# Altium footprint library Domino 3Pin.PcbLib: 350 footprints (part 16 of 22)
Each footprint in its own frame and in the unit in brackets; x right, y up, seen from the top. Pads: shape width x height; smd on the part's side, far side on the other; paste and mask are expansions set on the pad; w line width, h text height; cw(c..) or ccw(c..) is an arc to the next point about the centre after c.
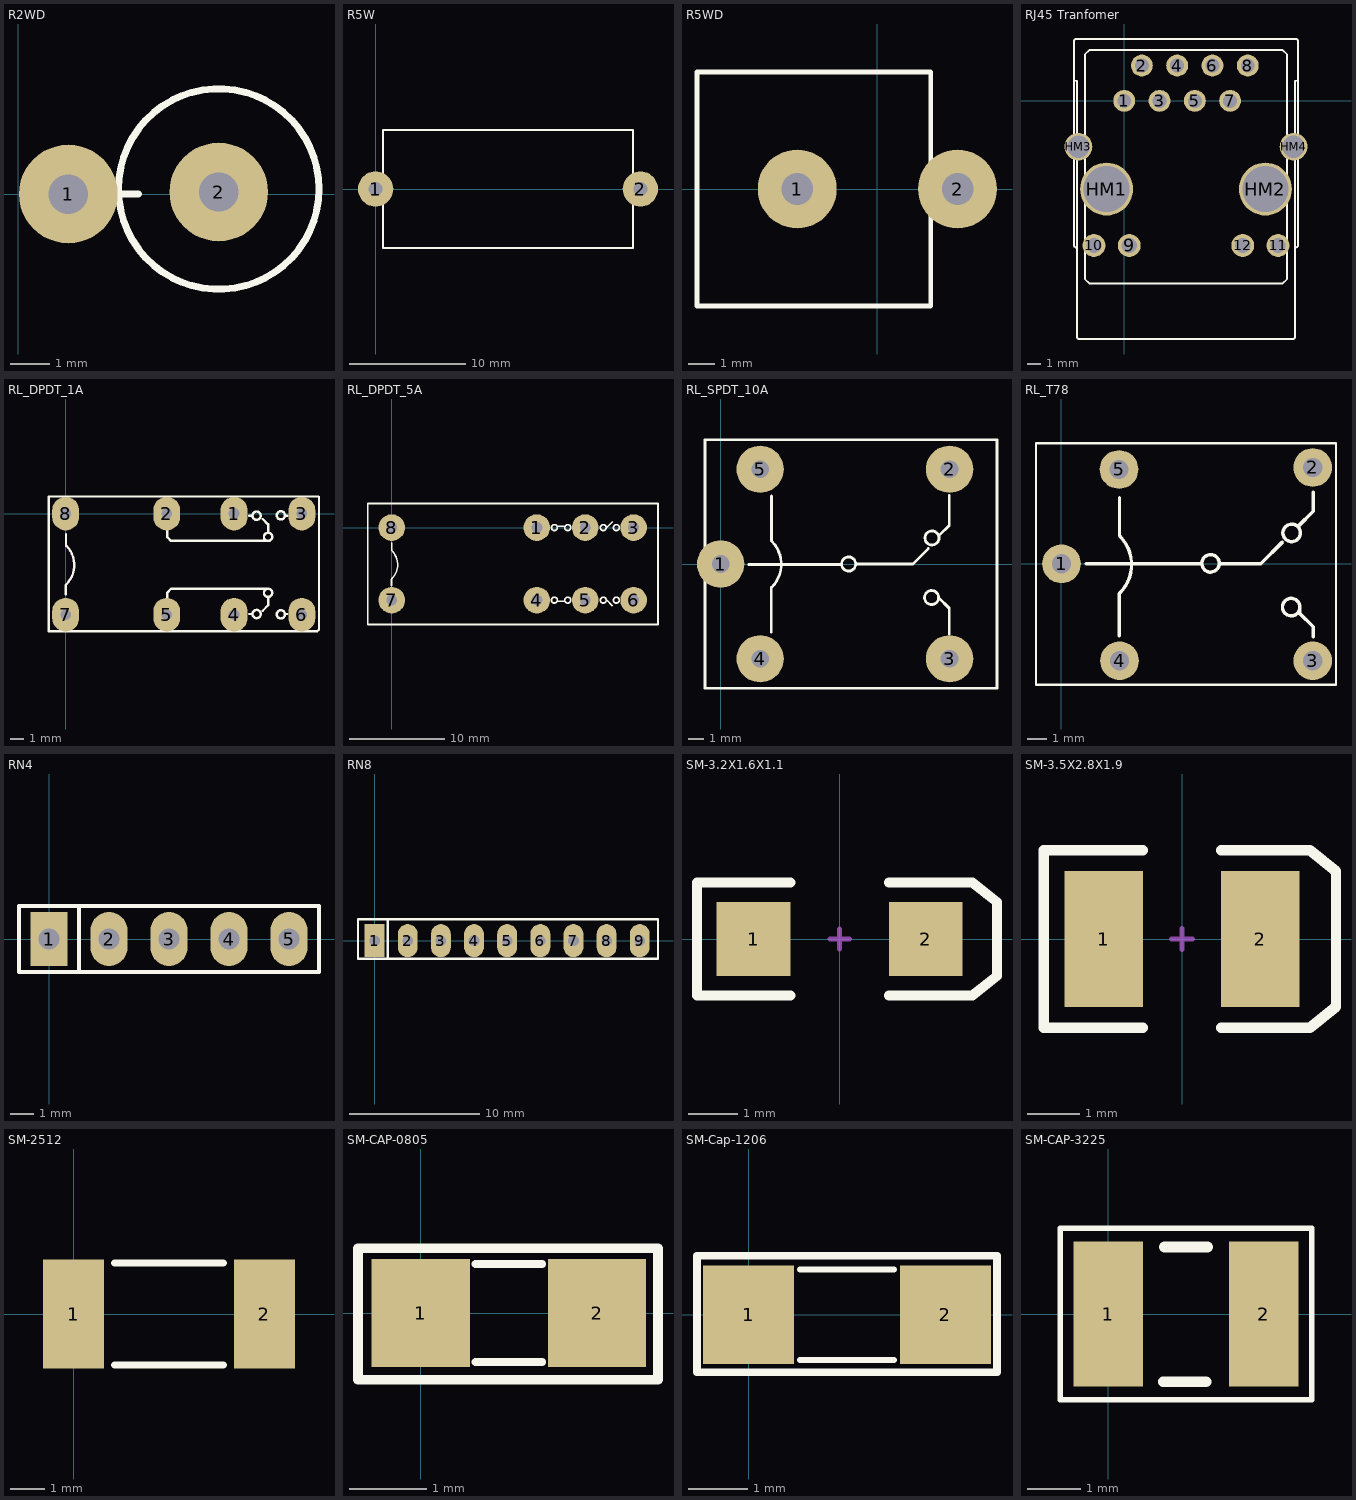
[diagram p15: the footprints below, top view; thin cyan lines are the x and y axes]

## R2WD [mm] "R2W, 2 pin, 700mil"
height 5.08
pads (2):
  round 2.5 hole 1: 1(1.27,0) 2(5.08,0.051)
Top Overlay:
  circle w0.178: c5.08,0.127 r2.54
  lines w0.178: 2.159,0 3.048,0

## R5W [mil] "R5W , 2 pin, 400 x 950mil"
height 400
pads (2):
  round 120 hole 47.24: 1(0,0) 2(900,0)
Top Overlay:
  lines w7: 25,-200 25,200 875,200 875,-200 25,-200
3D body "User Library-5W Resistor.STEP": height 362.6, standoff -98.43, extent -84.69,-190 954.68,191.89

## R5WD [mm] "R5W , 2 pin, 300 x 600 mil"
height 10.16
pads (2):
  round 3 hole 1.2: 1(-3.048,0) 2(3.048,0)
Top Overlay:
  lines w0.178: -6.858,-4.445 -6.858,4.445 2.032,4.445 2.032,-4.445 -6.858,-4.445
3D body "SW3dPS-5W Res.STEP": height 23.05, standoff -2.4, extent -8.648,-5.08 4.432,4.92

## RJ45 Tranfomer [mm]
pads (16):
  round 1.575 hole 1: 1(0,0) 2(1.27,2.54) 3(2.54,0) 4(3.81,2.54) 5(5.08,0) 6(6.35,2.54) 7(7.62,0) 8(8.89,2.54)
  round 1.65 hole 1.1: 9(0.36,-10.41) 10(-2.18,-10.41) 11(11.07,-10.41) 12(8.53,-10.41)
  round 3.81 hole 3.3: HM1(-1.27,-6.35) HM2(10.16,-6.35)
  round 2 hole 1.6: HM3(-3.3,-3.3) HM4(12.19,-3.3)
Top Overlay:
  lines w0.127: -3.62,1.45 -3.405,1.45 -3.405,-16.99 ccw(c-3.255,-16.99) -3.255,-17.14 12.145,-17.14 ccw(c12.145,-16.99) 12.295,-16.99 12.295,1.45 12.51,1.45 ; -3.405,-10.55 -3.47,-10.55 cw(c-3.47,-10.4) -3.62,-10.4 -3.62,4.3 cw(c-3.47,4.3) -3.47,4.45 12.36,4.45 cw(c12.36,4.3) 12.51,4.3 12.51,-10.4 cw(c12.36,-10.4) 12.36,-10.55 12.295,-10.55 ; -3.405,-3.81 -3.195,-3.81 -3.195,-2.79 -3.405,-2.79 ; -3.405,-3.61 -3.195,-3.61 ; -3.405,-2.99 -3.195,-2.99 ; -1.77,-7.764 cw(c-1.27,-6.35) -1.517,-7.829 ; -0.77,-7.764 ccw(c-1.27,-6.35) -0.77,-4.936 ; -0.132,-0.1 -0.132,0.1 ; 0.132,-0.1 0.132,0.1 ; 1.138,2.44 1.138,2.64 ; 1.402,2.44 1.402,2.64 ; 2.408,-0.1 2.408,0.1 ; 2.672,-0.1 2.672,0.1 ; 3.678,2.44 3.678,2.64 ; 3.942,2.44 3.942,2.64 ; 4.948,-0.1 4.948,0.1 ; 5.212,-0.1 5.212,0.1 ; 6.218,2.44 6.218,2.64 ; 6.482,2.44 6.482,2.64 ; 7.488,-0.1 7.488,0.1 ; 7.752,-0.1 7.752,0.1 ; 8.758,2.44 8.758,2.64 ; 9.022,2.44 9.022,2.64 ; 9.66,-7.764 cw(c10.16,-6.35) 9.66,-4.936 ; 10.16,-7.85 cw(c10.16,-6.35) 10.66,-7.764 ; 12.085,-3.61 12.295,-3.61 ; 12.085,-2.99 12.295,-2.99 ; 12.295,-3.81 12.085,-3.81 12.085,-2.79 12.295,-2.79 ; -2.82,-12.84 -2.52,-13.14 11.41,-13.14 11.71,-12.84 11.71,3.35 11.41,3.65 -2.52,3.65 -2.82,3.35 -2.82,-12.84 ; -2.43,-10.61 -1.93,-10.61 -1.93,-10.21 -2.43,-10.21 -2.43,-10.61 ; -1.77,-7.386 cw(c-1.27,-6.35) -1.77,-5.314 -1.77,-7.386 ; -0.77,-7.386 ccw(c-1.27,-6.35) -0.77,-5.314 -0.77,-7.386 ; -0.175,-0.1 0.175,-0.1 0.175,0.1 -0.175,0.1 -0.175,-0.1 ; 0.11,-10.61 0.61,-10.61 0.61,-10.21 0.11,-10.21 0.11,-10.61 ; 1.095,2.44 1.445,2.44 1.445,2.64 1.095,2.64 1.095,2.44 ; 2.365,-0.1 2.715,-0.1 2.715,0.1 2.365,0.1 2.365,-0.1 ; 3.635,2.44 3.985,2.44 3.985,2.64 3.635,2.64 3.635,2.44 ; 4.905,-0.1 4.905,0.1 5.255,0.1 5.255,-0.1 4.905,-0.1 ; 6.175,2.44 6.175,2.64 6.525,2.64 6.525,2.44 6.175,2.44 ; 7.445,-0.1 7.795,-0.1 7.795,0.1 7.445,0.1 7.445,-0.1 ; 8.28,-10.61 8.78,-10.61 8.78,-10.21 8.28,-10.21 8.28,-10.61 ; 8.715,2.44 9.065,2.44 9.065,2.64 8.715,2.64 8.715,2.44 ; 9.66,-7.386 cw(c10.16,-6.35) 9.66,-5.314 9.66,-7.386 ; 10.66,-7.386 ccw(c10.16,-6.35) 10.66,-5.314 10.66,-7.386 ; 10.82,-10.61 11.32,-10.61 11.32,-10.21 10.82,-10.21 10.82,-10.61
3D body "RJ45-SI-60062-F.STEP": height 13.84, standoff -3.35, extent -3.62,-17.143 12.51,4.447

## RL_DPDT_1A [mil] "Reley DPDT, 8 pin, 1A, W400mil, L800mil,H 300mil"
height 300
pads (8):
  oval 80x100 hole 32: 1(500,0) 2(300,0) 3(701,0) 4(500,-300) 5(300,-300) 6(701,-300) 7(0,-300) 8(0,0)
Top Overlay:
  circle w7: c638.76,-299 r12.24
  circle w7: c566.76,-298 r12.24
  circle w7: c600.76,-235 r12.24
  circle w7: c600.76,-69 r12.24
  circle w7: c566.76,-6 r12.24
  circle w7: c638.76,-5 r12.24
  lines w7: 0,-239 0,-212 ; 1,-211 ccw(c-56.5,-152.5) 2,-95 ; 1,-94 1,-61 ; 302,-255 302,-234 313,-223 599,-223 ; 302,-42 302,-70 313,-81 599,-81 ; 544,-298 552,-298 ; 544,-6 552,-6 ; 585,-288 601,-272 601,-249 ; 585,-16 601,-32 601,-55 ; 653,-298 658,-298 ; 653,-6 658,-6 ; -50,-349 -50,51 750,51 752,49 752,-344 747,-349 -50,-349
3D body "SW3dPS-DSY2Y.STEP": height 484.25, standoff -118.11, extent -59.45,-340 759.45,45.83

## RL_DPDT_5A [mil] "Reley DPDT, 8 pin, 5A, W500mil, L1100mil,H 950mil"
height 300
pads (8):
  round 110 hole 45: 1(600,0) 2(800,0) 3(1000,0) 4(600,-300) 5(800,-300) 6(1000,-300) 7(0,-300) 8(0,0)
Top Overlay:
  circle w7: c928.76,-300 r12.24
  circle w7: c874.76,-300 r12.24
  circle w7: c727.76,-300 r12.24
  circle w7: c672.76,-300 r12.24
  circle w7: c672.76,0 r12.24
  circle w7: c727.76,0 r12.24
  circle w7: c874.76,0 r12.24
  circle w7: c928.76,0 r12.24
  lines w7: -1,-240 -1,-213 ; 0,-212 ccw(c-57.5,-153.5) 1,-96 ; 0,-95 0,-62 ; 687,-305 716,-305 ; 687,5 716,5 ; 888,-299 912,-323 ; 888,-1 912,23 ; -99,-401 1101,-401 1101,100 -99,100 -99,-401

## RL_SPDT_10A [mil] "Relay SPDT, 5 pin, 10A,W 650mil, L 800mil, H 800mil"
height 800
pads (5):
  round 120 hole 45: 1(0,0) 2(580,240) 3(580,-240) 4(100,-240) 5(100,240)
Top Overlay:
  circle w7: c324.2,0 r17.8
  circle w7: c535.2,66 r17.8
  circle w7: c534.2,-85 r17.8
  lines w7: 71,-1 304,-1 ; 128,-173 128,-60 ; 129,-59 ccw(c71.5,-0.5) 130,57 ; 129,58 129,172 ; 344,0 487,0 526,39 ; 552,-85 579,-112 579,-178 ; 553,72 579,98 579,174 ; -40,-315 700,-315 700,315 -40,315 -40,-315
3D body "User Library-SONGLE Relay SRU-12VDC-SL-C.step": height 602.36, standoff -196.85, extent -45.98,-304.24 705.98,306

## RL_T78 [mm]
pads (5):
  round 2 hole 1: 1(0.025,0) 2(13.005,4.978) 3(13.005,-5.004) 4(3.023,-5.004) 5(2.997,4.877)
Top Overlay:
  circle w0.178: c11.892,-2.235 r0.452
  circle w0.178: c11.918,1.6 r0.452
  circle w0.178: c7.727,0.025 r0.452
  lines w0.127: -1.293,-6.258 -1.293,6.242 14.207,6.242 14.207,-6.258 -1.293,-6.258
  lines w0.178: 1.295,0 7.214,0 ; 2.997,-3.708 2.997,-1.549 ; 3.023,-1.524 ccw(c1.562,-0.038) 3.048,1.422 ; 3.023,1.448 3.023,3.429 ; 8.23,0 10.16,0 10.312,0 11.443,1.13 ; 12.243,1.93 13.03,2.718 13.03,3.708 ; 12.344,-2.235 12.344,-2.565 13.03,-3.251 13.03,-3.759
3D body: height 13.5, standoff 0, extent -1.295,-6.248 14.199,6.223

## RN4 [mil] "R SIP4, 5 Pin"
height 200
pads (5):
  rect 62x90 hole 35: 1(0,0)
  oval 62x90 hole 35: 2(100,0) 3(200,0) 4(300,0) 5(400,0)
Top Overlay:
  lines w7: 50,-55 50,55 ; -50,-55 -50,55 450,55 450,-55 -50,-55

## RN8 [mil] "R SIP8, 9 Pin"
height 200
pads (9):
  rect 60x100 hole 32: 1(0,0)
  oval 60x100 hole 32: 2(100,0) 3(200,0) 4(300,0) 5(400,0) 6(500,0) 7(600,0) 8(700,0) 9(800,0)
Top Overlay:
  lines w7: 40,-55 40,65 ; -50,-55 -50,65 855,65 855,-55 -50,-55
3D body "SW3dPS-Resistor Networks-1.STEP": height 219.29, standoff -115.35, extent -42.91,-20 842.92,29.21

## SM-3.2X1.6X1.1 [mm] "SMT LED; 2 Flat Leads"
height 1.2
pads (2):
  rect 1.5x1.5 smd: 1(-1.75,0) 2(1.75,0)
Top Overlay:
  lines w0.2: -1,-1.15 -2.9,-1.15 -2.9,1.15 -1,1.15 ; 1,-1.15 2.7,-1.15 3.2,-0.75 3.2,0.75 2.7,1.15 1,1.15
Mechanical 1:
  lines w0.1: -0.2,0 0.2,0 ; 0,-0.2 0,0.2
3D body "SW3DPS-RESISTOR 1206-DEFAULT.STEP": height 0.53, standoff -0.03, extent -1.473,-0.889 1.727,0.771

## SM-3.5X2.8X1.9 [mm] "SM LED; 2 C-Bend Leads; Body 3.5 x 2.8 x 1.9 mm, inc leads (LxWxH typ)"
height 1.9
pads (2):
  rect 1.5x2.6 smd: 1(-1.5,0) 2(1.5,0)
Top Overlay:
  lines w0.2: -0.75,-1.7 -2.65,-1.7 -2.65,1.7 -0.75,1.7 ; 0.75,-1.7 2.45,-1.7 2.95,-1.3 2.95,1.3 2.45,1.7 0.75,1.7
Mechanical 1:
  lines w0.1: -0.2,0 0.2,0 ; 0,-0.2 0,0.2

## SM-2512 [mm] "Chip Resistor; Body 6.3 x 3.2 mm (LxW typ) - C"
height 0.6
pads (2):
  rect 1.8x3.2 smd: 1(0,0) 2(5.6,0)
Top Overlay:
  lines w0.2: 1.2,-1.5 4.4,-1.5 ; 1.2,1.5 4.4,1.5
3D body "Resistor SMD 2512.step": height 0.62, standoff 0, extent -0.492,-1.575 5.827,1.626

## SM-CAP-0805 [mil]
pads (2):
  rect 50x55 smd: 1(0,0) 2(90,0)
Top Overlay:
  lines w4: 28,-25 62,-25 ; 28,25 62,25
  lines w5: -32,-34 121,-34 121,33 -32,33 -32,-34
3D body "0805 SMD Capacitor.step": height 31.39, standoff 0.6, extent 5.64,-24.6 84.37,24.61

## SM-Cap-1206 [mil]
pads (2):
  rect 60x65 smd: 1(0,0) 2(130,0)
Top Overlay:
  lines w4: 34,-30 96,-30 ; 34,30 96,30
  lines w5: -34,-38 -34,39 164,39 164,-38 -34,-38
3D body "1206 SMD Capacitor.step": height 40.05, standoff 0.6, extent 1.01,-31.49 127,31.51

## SM-CAP-3225 [mm] "Chip Capacitor, Body 3.2x2.5mm, IPC Medium Density"
height 1.35
pads (2):
  rect 1.3x2.7 smd: 1(0,0) 2(2.9,0)
Top Overlay:
  lines w0.1: -0.9,-1.6 3.8,-1.6 3.8,1.6 -0.9,1.6 -0.9,-1.6
  lines w0.2: 1.025,-1.265 1.825,-1.265 ; 1.05,1.25 1.85,1.25
3D body "SMD Capacitor 3225.step": height 1, standoff 0, extent -0.175,-1.25 3.025,1.25